# Altium footprint library PcbLib1.PcbLib: 56 footprints (part 4 of 4)
Each footprint in its own frame and in the unit in brackets; x right, y up, seen from the top. Pads: shape width x height; smd on the part's side, far side on the other; paste and mask are expansions set on the pad; w line width, h text height; cw(c..) or ccw(c..) is an arc to the next point about the centre after c.
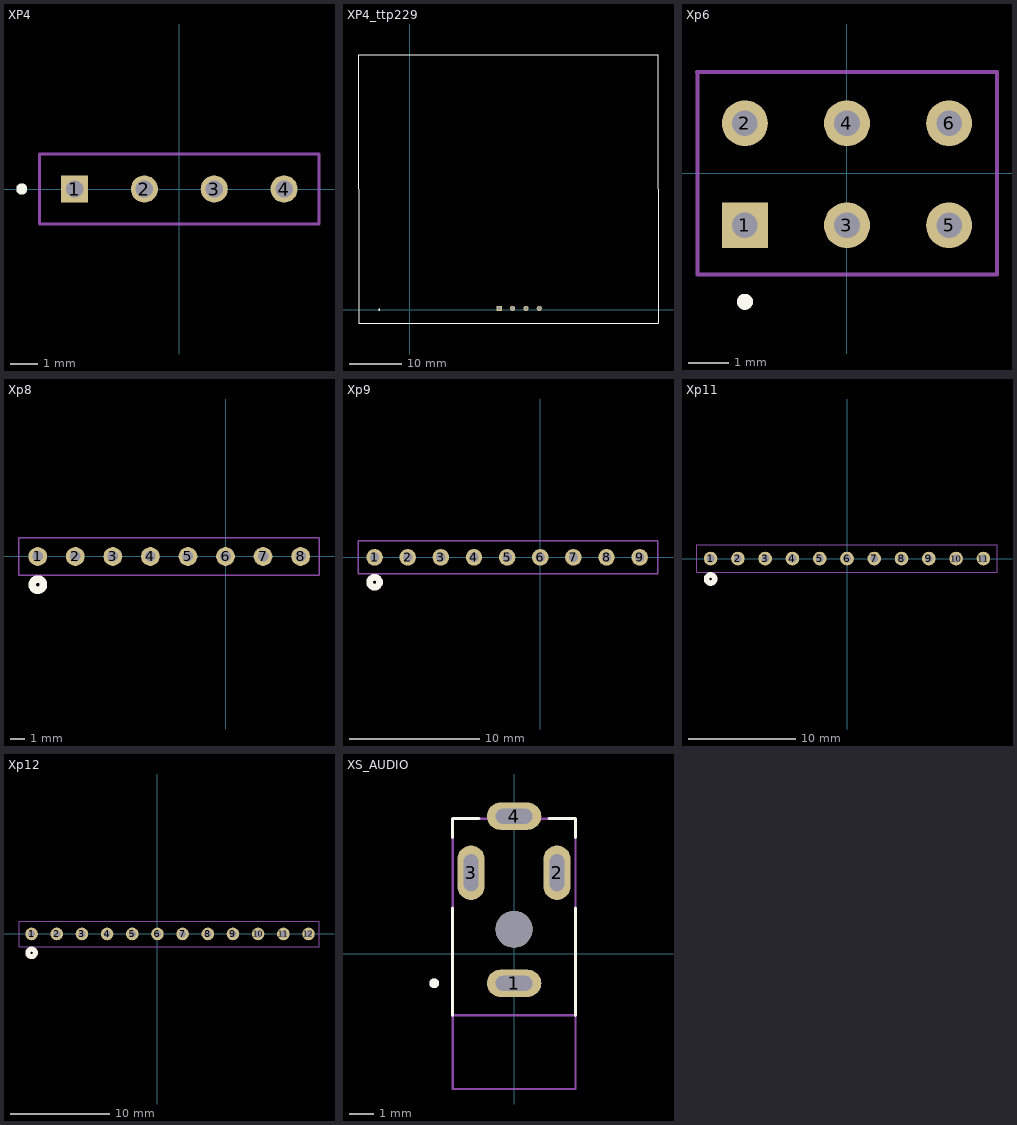
[diagram p3: the footprints below, top view; thin cyan lines are the x and y axes]

## XP4 [mm]
pads (4):
  rect 0.985x0.985 hole 0.635: 1(-3.81,0)
  round 0.985 hole 0.635: 2(-1.27,0) 3(1.27,0) 4(3.81,0)
Top Overlay:
  circle w0.2: c-5.73,0 r0.1
Top Assembly:
  lines w0.1: -5.08,-1.27 -5.08,1.27 ; -5.08,-1.27 -5.08,1.27 ; -5.08,-1.27 5.08,-1.27 ; -5.08,1.27 5.08,1.27 ; -5.08,1.27 5.08,1.27 ; 5.08,-1.27 5.08,1.27 ; 5.08,-1.27 5.08,1.27
3D body "xp4.stp": height 8.28, standoff -3.84, extent -5.156,-1.32 5.207,1.22

## XP4_ttp229 [mm]
pads (4):
  rect 0.985x0.985 hole 0.635: 1(16.99,0.25)
  round 0.985 hole 0.635: 2(19.53,0.25) 3(22.07,0.25) 4(24.61,0.25)
Top Overlay:
  circle w0.2: c-5.73,0 r0.1
  lines w0.1: -9.791,48.325 47.125,48.325 47.125,-2.525 -9.615,-2.525 -9.791,48.325
3D body "xp4.stp": height 8.28, standoff -3.84, extent 15.644,-1.07 26.007,1.47
3D body "KP Touch Contacts.stp": height 9.5, standoff 5, extent -9.2,-2.2 46.8,47.8

## Xp6 [mil]
pads (6):
  rect 45x45 / inner round 45 / far side rect 45x45 hole 25 mask+4.02: 1(-100,-50.98)
  round 45 hole 25 mask+4.02: 2(-100,49.02) 3(0,-50.98) 4(0,49.02) 5(100,-50.98) 6(100,49.02)
Top Overlay:
  circle w7.87: c-100,-125.98 r3.94
Top Assembly:
  lines w3.94: -147,99.02 147,99.02 147,-99.41 ; -146.65,98.43 -146.65,-99.41 144.68,-99.41
3D body "xp6.stp": height 326, standoff -151, extent -146.99,-99.01 147,100.99

## Xp8 [mil]
pads (8):
  round 50 hole 28 paste-99999 mask+0: 1(-500,0) 2(-400,0) 3(-300,0) 4(-200,0) 5(-100,0) 6(0,0) 7(100,0) 8(200,0)
Top Overlay:
  circle w20: c-500,-75 r15
Bottom Overlay:
  circle w20: c-500,-75 r15
Top Assembly:
  lines w3.94: -550,-50 249.02,-50 249.02,50 -550,50 -550,-50
Mechanical 13:
  circle w1: c-500,0 r10

## Xp9 [mil]
pads (9):
  round 50 hole 28 paste-99999 mask+0: 1(-500,0) 2(-400,0) 3(-300,0) 4(-200,0) 5(-100,0) 6(0,0) 7(100,0) 8(200,0) 9(300,0)
Top Overlay:
  circle w20: c-500,-75 r15
Bottom Overlay:
  circle w20: c-500,-75 r15
Top Assembly:
  lines w3.94: -550,-50 355.31,-50 355.31,50 -550,50 -550,-50
Mechanical 13:
  circle w1: c-500,0 r10

## Xp11 [mil]
pads (11):
  round 50 hole 28 paste-99999 mask+0: 1(-500,0) 2(-400,0) 3(-300,0) 4(-200,0) 5(-100,0) 6(0,0) 7(100,0) 8(200,0) 9(300,0) 10(400,0) 11(500,0)
Top Overlay:
  circle w20: c-500,-75 r15
Bottom Overlay:
  circle w20: c-500,-75 r15
Top Assembly:
  lines w3.94: -550,-50 550,-50 550,50 -550,50 -550,-50
Mechanical 13:
  circle w1: c-500,0 r10
3D body "xp11.stp": height 326, standoff -151, extent -552.03,-49.01 555.97,50.99
3D body "xp11.stp": height 326, standoff -151, extent -553.99,-49.99 554.01,50.01

## Xp12 [mil]
pads (12):
  round 50 hole 28 paste-99999 mask+0: 1(-500,0) 2(-400,0) 3(-300,0) 4(-200,0) 5(-100,0) 6(0,0) 7(100,0) 8(200,0) 9(300,0) 10(400,0) 11(500,0) 12(600,0)
Top Overlay:
  circle w20: c-500,-75 r15
Bottom Overlay:
  circle w20: c-500,-75 r15
Top Assembly:
  lines w3.94: -550,-50 -550,50 641.73,50 641.73,-50 -550,-50
Mechanical 13:
  circle w1: c-500,0 r10

## XS_AUDIO [mm]
pads (5):
  oval 2.216x1.108 hole 0.6 slot 1.5 at 0 deg mask+0.102: 1(0,-1.2) 4(0,5.6)
  oval 1.108x2.216 hole 0.6 slot 1.5 at 90 deg mask+0.102: 2(1.75,3.3) 3(-1.75,3.3)
  round 1.5 hole 1.5 unplated mask+0: ""(0,1)
Top Overlay:
  circle w0.2: c-3.25,-1.2 r0.1
  lines w0.127: -2.5,-2.5 -2.5,1.872 ; -2.5,4.728 -2.5,5.5 -1.428,5.5 ; 1.428,5.5 2.5,5.5 2.5,4.728 ; 2.5,-2.5 2.5,1.872
Top Assembly:
  lines w0.1: -2.5,-2.5 -2.5,5.5 2.5,5.5 2.5,-2.5 ; -2.5,-2.5 -2.5,-5.5 2.5,-5.5 2.5,-2.5 ; -2.5,-2.5 2.5,-2.5
Mechanical 13:
  circle w0.2: c-3.25,-1.2 r0.1
3D body "step_temp.STEP": height 4.79, standoff -2.73, extent -2.467,-5.75 2.533,5.5